# Altium schematic symbol library jlcpcb_2025_04_capacitors_extended_0805.schlib: 3281 symbols (part 17 of 18)
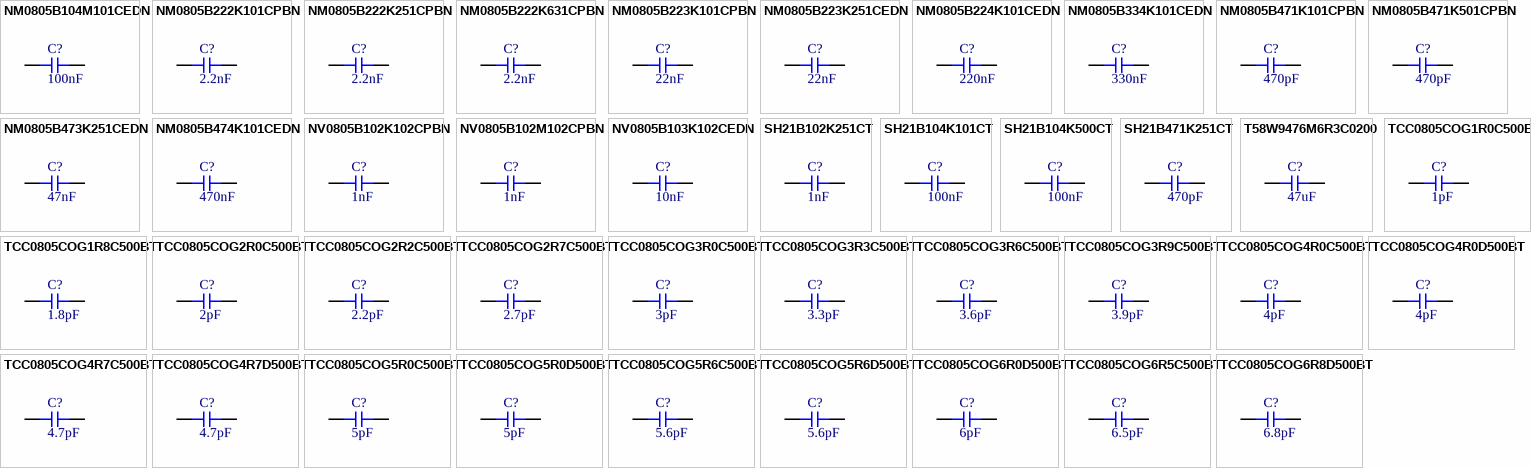
[diagram p98: symbols NM0805B104M101CEDN to TCC0805COG6R8D500BT]

## SH21B104K500CT
designator C?  Capacitance: 100nF  (hidden comment: *)
Capacitor, Ceramic (MLCC), 100nF, ±10%, 50V, X7R, ±10%, SMD 0805; Manufacturer: Walsin Tech Corp; Manufacturer Part Number: SH21B104K500CT; Package Size: 0805; JLCPCB Basic Part: No; JLCPCB Part Number: C384661; Supplier 1: LCSC; Category: Capacitors - MLCC; Supplier Part Number 1: C384661; Tolerance: ±10%; Voltage Rating: 50V; Temperature Coefficient: X7R; RoHS: Yes; ComponentLink1Description: Datasheet; ComponentLink1URL: https://wmsc.lcsc.com/wmsc/upload/file/pdf/v2/lcsc/2401181553_Walsin-Tech-Corp-SH21B104K500CT_C384661.pdf; ComponentLink2Description: JLCPCB Part URL; ComponentLink2URL: https://jlcpcb.com/partdetail/C384661; ComponentLink3Description: LCSC Part URL; ComponentLink3URL: https://lcsc.com/product-detail/Multilayer-Ceramic-Capacitors-MLCC---SMD-SMT_Walsin-Tech-Corp-Walsin-Tech-Corp-SH21B104K500CT_C384661.html
footprint CAP-0805 (0805 (2012M) Capacitor)
pins: 1, 2

## SH21B471K251CT
designator C?  Capacitance: 470pF  (hidden comment: *)
Capacitor, Ceramic (MLCC), 470pF, ±10%, 250V, X7R, ±10%, SMD 0805; Manufacturer: Walsin Tech Corp; Manufacturer Part Number: SH21B471K251CT; Package Size: 0805; JLCPCB Basic Part: No; JLCPCB Part Number: C2859399; Supplier 1: LCSC; Category: Capacitors - MLCC; Supplier Part Number 1: C2859399; Tolerance: ±10%; Voltage Rating: 250V; Temperature Coefficient: X7R; RoHS: Yes; ComponentLink1Description: Datasheet; ComponentLink1URL: https://wmsc.lcsc.com/wmsc/upload/file/pdf/v2/lcsc/2108150330_Walsin-Tech-Corp-SH21B471K251CT_C2859399.pdf; ComponentLink2Description: JLCPCB Part URL; ComponentLink2URL: https://jlcpcb.com/partdetail/C2859399; ComponentLink3Description: LCSC Part URL; ComponentLink3URL: https://lcsc.com/product-detail/Multilayer-Ceramic-Capacitors-MLCC---SMD-SMT_Walsin-Tech-Corp-Walsin-Tech-Corp-SH21B471K251CT_C2859399.html
footprint CAP-0805 (0805 (2012M) Capacitor)
pins: 1, 2

## T58W9476M6R3C0200
designator C?  Capacitance: 47uF  (hidden comment: *)
Capacitor, Ceramic (MLCC), 47uF, ±20%, ±20%, SMD 0805; Manufacturer: Vishay Intertech; Manufacturer Part Number: T58W9476M6R3C0200; Package Size: 0805; JLCPCB Basic Part: No; JLCPCB Part Number: C3008877; Supplier 1: LCSC; Category: Capacitors - MLCC; Supplier Part Number 1: C3008877; Tolerance: ±20%; RoHS: Yes; ComponentLink1Description: Datasheet; ComponentLink1URL: https://wmsc.lcsc.com/wmsc/upload/file/pdf/v2/lcsc/2206101730_Vishay-Intertech-T58W9476M6R3C0200_C3008877.pdf; ComponentLink2Description: JLCPCB Part URL; ComponentLink2URL: https://jlcpcb.com/partdetail/C3008877; ComponentLink3Description: LCSC Part URL; ComponentLink3URL: https://lcsc.com/product-detail/Tantalum-Capacitors_Vishay-Intertech-Vishay-Intertech-T58W9476M6R3C0200_C3008877.html
footprint CAP-0805 (0805 (2012M) Capacitor)
pins: 1, 2

## TCC0805COG1R0C500BT
designator C?  Capacitance: 1pF  (hidden comment: *)
Capacitor, Ceramic (MLCC), 1pF, 50V, C0G, SMD 0805; Manufacturer: CCTC; Manufacturer Part Number: TCC0805COG1R0C500BT; Package Size: 0805; JLCPCB Basic Part: No; JLCPCB Part Number: C282692; Supplier 1: LCSC; Category: Capacitors - MLCC; Supplier Part Number 1: C282692; Voltage Rating: 50V; Temperature Coefficient: C0G; RoHS: Yes; ComponentLink1Description: Datasheet; ComponentLink1URL: https://wmsc.lcsc.com/wmsc/upload/file/pdf/v2/lcsc/2304140030_CCTC-TCC0805COG1R0C500BT_C282692.pdf; ComponentLink2Description: JLCPCB Part URL; ComponentLink2URL: https://jlcpcb.com/partdetail/C282692; ComponentLink3Description: LCSC Part URL; ComponentLink3URL: https://lcsc.com/product-detail/Multilayer-Ceramic-Capacitors-MLCC---SMD-SMT_CCTC-CCTC-TCC0805COG1R0C500BT_C282692.html
footprint CAP-0805 (0805 (2012M) Capacitor)
pins: 1, 2

## TCC0805COG1R8C500BT
designator C?  Capacitance: 1.8pF  (hidden comment: *)
Capacitor, Ceramic (MLCC), 1.8pF, 50V, C0G, SMD 0805; Manufacturer: CCTC; Manufacturer Part Number: TCC0805COG1R8C500BT; Package Size: 0805; JLCPCB Basic Part: No; JLCPCB Part Number: C376870; Supplier 1: LCSC; Category: Capacitors - MLCC; Supplier Part Number 1: C376870; Voltage Rating: 50V; Temperature Coefficient: C0G; RoHS: Yes; ComponentLink1Description: Datasheet; ComponentLink1URL: https://wmsc.lcsc.com/wmsc/upload/file/pdf/v2/lcsc/2304140030_CCTC-TCC0805COG1R8C500BT_C376870.pdf; ComponentLink2Description: JLCPCB Part URL; ComponentLink2URL: https://jlcpcb.com/partdetail/C376870; ComponentLink3Description: LCSC Part URL; ComponentLink3URL: https://lcsc.com/product-detail/Multilayer-Ceramic-Capacitors-MLCC---SMD-SMT_CCTC-CCTC-TCC0805COG1R8C500BT_C376870.html
footprint CAP-0805 (0805 (2012M) Capacitor)
pins: 1, 2

## TCC0805COG2R0C500BT
designator C?  Capacitance: 2pF  (hidden comment: *)
Capacitor, Ceramic (MLCC), 2pF, 50V, C0G, SMD 0805; Manufacturer: CCTC; Manufacturer Part Number: TCC0805COG2R0C500BT; Package Size: 0805; JLCPCB Basic Part: No; JLCPCB Part Number: C282695; Supplier 1: LCSC; Category: Capacitors - MLCC; Supplier Part Number 1: C282695; Voltage Rating: 50V; Temperature Coefficient: C0G; RoHS: Yes; ComponentLink1Description: Datasheet; ComponentLink1URL: https://wmsc.lcsc.com/wmsc/upload/file/pdf/v2/lcsc/2304140030_CCTC-TCC0805COG2R0C500BT_C282695.pdf; ComponentLink2Description: JLCPCB Part URL; ComponentLink2URL: https://jlcpcb.com/partdetail/C282695; ComponentLink3Description: LCSC Part URL; ComponentLink3URL: https://lcsc.com/product-detail/Multilayer-Ceramic-Capacitors-MLCC---SMD-SMT_CCTC-CCTC-TCC0805COG2R0C500BT_C282695.html
footprint CAP-0805 (0805 (2012M) Capacitor)
pins: 1, 2

## TCC0805COG2R2C500BT
designator C?  Capacitance: 2.2pF  (hidden comment: *)
Capacitor, Ceramic (MLCC), 2.2pF, 50V, C0G, SMD 0805; Manufacturer: CCTC; Manufacturer Part Number: TCC0805COG2R2C500BT; Package Size: 0805; JLCPCB Basic Part: No; JLCPCB Part Number: C376879; Supplier 1: LCSC; Category: Capacitors - MLCC; Supplier Part Number 1: C376879; Voltage Rating: 50V; Temperature Coefficient: C0G; RoHS: Yes; ComponentLink1Description: Datasheet; ComponentLink1URL: https://wmsc.lcsc.com/wmsc/upload/file/pdf/v2/lcsc/2304140030_CCTC-TCC0805COG2R2C500BT_C376879.pdf; ComponentLink2Description: JLCPCB Part URL; ComponentLink2URL: https://jlcpcb.com/partdetail/C376879; ComponentLink3Description: LCSC Part URL; ComponentLink3URL: https://lcsc.com/product-detail/Multilayer-Ceramic-Capacitors-MLCC---SMD-SMT_CCTC-CCTC-TCC0805COG2R2C500BT_C376879.html
footprint CAP-0805 (0805 (2012M) Capacitor)
pins: 1, 2

## TCC0805COG2R7C500BT
designator C?  Capacitance: 2.7pF  (hidden comment: *)
Capacitor, Ceramic (MLCC), 2.7pF, 50V, C0G, SMD 0805; Manufacturer: CCTC; Manufacturer Part Number: TCC0805COG2R7C500BT; Package Size: 0805; JLCPCB Basic Part: No; JLCPCB Part Number: C282696; Supplier 1: LCSC; Category: Capacitors - MLCC; Supplier Part Number 1: C282696; Voltage Rating: 50V; Temperature Coefficient: C0G; RoHS: Yes; ComponentLink1Description: Datasheet; ComponentLink1URL: https://wmsc.lcsc.com/wmsc/upload/file/pdf/v2/lcsc/2304140030_CCTC-TCC0805COG2R7C500BT_C282696.pdf; ComponentLink2Description: JLCPCB Part URL; ComponentLink2URL: https://jlcpcb.com/partdetail/C282696; ComponentLink3Description: LCSC Part URL; ComponentLink3URL: https://lcsc.com/product-detail/Multilayer-Ceramic-Capacitors-MLCC---SMD-SMT_CCTC-CCTC-TCC0805COG2R7C500BT_C282696.html
footprint CAP-0805 (0805 (2012M) Capacitor)
pins: 1, 2

## TCC0805COG3R0C500BT
designator C?  Capacitance: 3pF  (hidden comment: *)
Capacitor, Ceramic (MLCC), 3pF, 50V, C0G, SMD 0805; Manufacturer: CCTC; Manufacturer Part Number: TCC0805COG3R0C500BT; Package Size: 0805; JLCPCB Basic Part: No; JLCPCB Part Number: C376882; Supplier 1: LCSC; Category: Capacitors - MLCC; Supplier Part Number 1: C376882; Voltage Rating: 50V; Temperature Coefficient: C0G; RoHS: Yes; ComponentLink1Description: Datasheet; ComponentLink1URL: https://wmsc.lcsc.com/wmsc/upload/file/pdf/v2/lcsc/2304140030_CCTC-TCC0805COG3R0C500BT_C376882.pdf; ComponentLink2Description: JLCPCB Part URL; ComponentLink2URL: https://jlcpcb.com/partdetail/C376882; ComponentLink3Description: LCSC Part URL; ComponentLink3URL: https://lcsc.com/product-detail/Multilayer-Ceramic-Capacitors-MLCC---SMD-SMT_CCTC-CCTC-TCC0805COG3R0C500BT_C376882.html
footprint CAP-0805 (0805 (2012M) Capacitor)
pins: 1, 2

## TCC0805COG3R3C500BT
designator C?  Capacitance: 3.3pF  (hidden comment: *)
Capacitor, Ceramic (MLCC), 3.3pF, 50V, C0G, SMD 0805; Manufacturer: CCTC; Manufacturer Part Number: TCC0805COG3R3C500BT; Package Size: 0805; JLCPCB Basic Part: No; JLCPCB Part Number: C376884; Supplier 1: LCSC; Category: Capacitors - MLCC; Supplier Part Number 1: C376884; Voltage Rating: 50V; Temperature Coefficient: C0G; RoHS: Yes; ComponentLink1Description: Datasheet; ComponentLink1URL: https://wmsc.lcsc.com/wmsc/upload/file/pdf/v2/lcsc/2304140030_CCTC-TCC0805COG3R3C500BT_C376884.pdf; ComponentLink2Description: JLCPCB Part URL; ComponentLink2URL: https://jlcpcb.com/partdetail/C376884; ComponentLink3Description: LCSC Part URL; ComponentLink3URL: https://lcsc.com/product-detail/Multilayer-Ceramic-Capacitors-MLCC---SMD-SMT_CCTC-CCTC-TCC0805COG3R3C500BT_C376884.html
footprint CAP-0805 (0805 (2012M) Capacitor)
pins: 1, 2

## TCC0805COG3R6C500BT
designator C?  Capacitance: 3.6pF  (hidden comment: *)
Capacitor, Ceramic (MLCC), 3.6pF, 50V, C0G, SMD 0805; Manufacturer: CCTC; Manufacturer Part Number: TCC0805COG3R6C500BT; Package Size: 0805; JLCPCB Basic Part: No; JLCPCB Part Number: C376886; Supplier 1: LCSC; Category: Capacitors - MLCC; Supplier Part Number 1: C376886; Voltage Rating: 50V; Temperature Coefficient: C0G; RoHS: Yes; ComponentLink1Description: Datasheet; ComponentLink1URL: https://wmsc.lcsc.com/wmsc/upload/file/pdf/v2/lcsc/2304140030_CCTC-TCC0805COG3R6C500BT_C376886.pdf; ComponentLink2Description: JLCPCB Part URL; ComponentLink2URL: https://jlcpcb.com/partdetail/C376886; ComponentLink3Description: LCSC Part URL; ComponentLink3URL: https://lcsc.com/product-detail/Multilayer-Ceramic-Capacitors-MLCC---SMD-SMT_CCTC-CCTC-TCC0805COG3R6C500BT_C376886.html
footprint CAP-0805 (0805 (2012M) Capacitor)
pins: 1, 2

## TCC0805COG3R9C500BT
designator C?  Capacitance: 3.9pF  (hidden comment: *)
Capacitor, Ceramic (MLCC), 3.9pF, 50V, C0G, SMD 0805; Manufacturer: CCTC; Manufacturer Part Number: TCC0805COG3R9C500BT; Package Size: 0805; JLCPCB Basic Part: No; JLCPCB Part Number: C376887; Supplier 1: LCSC; Category: Capacitors - MLCC; Supplier Part Number 1: C376887; Voltage Rating: 50V; Temperature Coefficient: C0G; RoHS: Yes; ComponentLink1Description: Datasheet; ComponentLink1URL: https://wmsc.lcsc.com/wmsc/upload/file/pdf/v2/lcsc/2304140030_CCTC-TCC0805COG3R9C500BT_C376887.pdf; ComponentLink2Description: JLCPCB Part URL; ComponentLink2URL: https://jlcpcb.com/partdetail/C376887; ComponentLink3Description: LCSC Part URL; ComponentLink3URL: https://lcsc.com/product-detail/Multilayer-Ceramic-Capacitors-MLCC---SMD-SMT_CCTC-CCTC-TCC0805COG3R9C500BT_C376887.html
footprint CAP-0805 (0805 (2012M) Capacitor)
pins: 1, 2

## TCC0805COG4R0C500BT
designator C?  Capacitance: 4pF  (hidden comment: *)
Capacitor, Ceramic (MLCC), 4pF, 50V, C0G, SMD 0805; Manufacturer: CCTC; Manufacturer Part Number: TCC0805COG4R0C500BT; Package Size: 0805; JLCPCB Basic Part: No; JLCPCB Part Number: C282704; Supplier 1: LCSC; Category: Capacitors - MLCC; Supplier Part Number 1: C282704; Voltage Rating: 50V; Temperature Coefficient: C0G; RoHS: Yes; ComponentLink1Description: Datasheet; ComponentLink1URL: https://wmsc.lcsc.com/wmsc/upload/file/pdf/v2/lcsc/2304140030_CCTC-TCC0805COG4R0C500BT_C282704.pdf; ComponentLink2Description: JLCPCB Part URL; ComponentLink2URL: https://jlcpcb.com/partdetail/C282704; ComponentLink3Description: LCSC Part URL; ComponentLink3URL: https://lcsc.com/product-detail/Multilayer-Ceramic-Capacitors-MLCC---SMD-SMT_CCTC-CCTC-TCC0805COG4R0C500BT_C282704.html
footprint CAP-0805 (0805 (2012M) Capacitor)
pins: 1, 2

## TCC0805COG4R0D500BT
designator C?  Capacitance: 4pF  (hidden comment: *)
Capacitor, Ceramic (MLCC), 4pF, 50V, C0G, SMD 0805; Manufacturer: CCTC; Manufacturer Part Number: TCC0805COG4R0D500BT; Package Size: 0805; JLCPCB Basic Part: No; JLCPCB Part Number: C376897; Supplier 1: LCSC; Category: Capacitors - MLCC; Supplier Part Number 1: C376897; Voltage Rating: 50V; Temperature Coefficient: C0G; RoHS: Yes; ComponentLink1Description: Datasheet; ComponentLink1URL: https://wmsc.lcsc.com/wmsc/upload/file/pdf/v2/lcsc/2304140030_CCTC-TCC0805COG4R0D500BT_C376897.pdf; ComponentLink2Description: JLCPCB Part URL; ComponentLink2URL: https://jlcpcb.com/partdetail/C376897; ComponentLink3Description: LCSC Part URL; ComponentLink3URL: https://lcsc.com/product-detail/Multilayer-Ceramic-Capacitors-MLCC---SMD-SMT_CCTC-CCTC-TCC0805COG4R0D500BT_C376897.html
footprint CAP-0805 (0805 (2012M) Capacitor)
pins: 1, 2

## TCC0805COG4R7C500BT
designator C?  Capacitance: 4.7pF  (hidden comment: *)
Capacitor, Ceramic (MLCC), 4.7pF, 50V, C0G, SMD 0805; Manufacturer: CCTC; Manufacturer Part Number: TCC0805COG4R7C500BT; Package Size: 0805; JLCPCB Basic Part: No; JLCPCB Part Number: C376898; Supplier 1: LCSC; Category: Capacitors - MLCC; Supplier Part Number 1: C376898; Voltage Rating: 50V; Temperature Coefficient: C0G; RoHS: Yes; ComponentLink1Description: Datasheet; ComponentLink1URL: https://wmsc.lcsc.com/wmsc/upload/file/pdf/v2/lcsc/2304140030_CCTC-TCC0805COG4R7C500BT_C376898.pdf; ComponentLink2Description: JLCPCB Part URL; ComponentLink2URL: https://jlcpcb.com/partdetail/C376898; ComponentLink3Description: LCSC Part URL; ComponentLink3URL: https://lcsc.com/product-detail/Multilayer-Ceramic-Capacitors-MLCC---SMD-SMT_CCTC-CCTC-TCC0805COG4R7C500BT_C376898.html
footprint CAP-0805 (0805 (2012M) Capacitor)
pins: 1, 2

## TCC0805COG4R7D500BT
designator C?  Capacitance: 4.7pF  (hidden comment: *)
Capacitor, Ceramic (MLCC), 4.7pF, 50V, C0G, SMD 0805; Manufacturer: CCTC; Manufacturer Part Number: TCC0805COG4R7D500BT; Package Size: 0805; JLCPCB Basic Part: No; JLCPCB Part Number: C376899; Supplier 1: LCSC; Category: Capacitors - MLCC; Supplier Part Number 1: C376899; Voltage Rating: 50V; Temperature Coefficient: C0G; RoHS: Yes; ComponentLink1Description: Datasheet; ComponentLink1URL: https://wmsc.lcsc.com/wmsc/upload/file/pdf/v2/lcsc/2304140030_CCTC-TCC0805COG4R7D500BT_C376899.pdf; ComponentLink2Description: JLCPCB Part URL; ComponentLink2URL: https://jlcpcb.com/partdetail/C376899; ComponentLink3Description: LCSC Part URL; ComponentLink3URL: https://lcsc.com/product-detail/Multilayer-Ceramic-Capacitors-MLCC---SMD-SMT_CCTC-CCTC-TCC0805COG4R7D500BT_C376899.html
footprint CAP-0805 (0805 (2012M) Capacitor)
pins: 1, 2

## TCC0805COG5R0C500BT
designator C?  Capacitance: 5pF  (hidden comment: *)
Capacitor, Ceramic (MLCC), 5pF, 50V, C0G, SMD 0805; Manufacturer: CCTC; Manufacturer Part Number: TCC0805COG5R0C500BT; Package Size: 0805; JLCPCB Basic Part: No; JLCPCB Part Number: C309040; Supplier 1: LCSC; Category: Capacitors - MLCC; Supplier Part Number 1: C309040; Voltage Rating: 50V; Temperature Coefficient: C0G; RoHS: Yes; ComponentLink1Description: Datasheet; ComponentLink1URL: https://wmsc.lcsc.com/wmsc/upload/file/pdf/v2/lcsc/2304140030_CCTC-TCC0805COG5R0C500BT_C309040.pdf; ComponentLink2Description: JLCPCB Part URL; ComponentLink2URL: https://jlcpcb.com/partdetail/C309040; ComponentLink3Description: LCSC Part URL; ComponentLink3URL: https://lcsc.com/product-detail/Multilayer-Ceramic-Capacitors-MLCC---SMD-SMT_CCTC-CCTC-TCC0805COG5R0C500BT_C309040.html
footprint CAP-0805 (0805 (2012M) Capacitor)
pins: 1, 2

## TCC0805COG5R0D500BT
designator C?  Capacitance: 5pF  (hidden comment: *)
Capacitor, Ceramic (MLCC), 5pF, 50V, C0G, SMD 0805; Manufacturer: CCTC; Manufacturer Part Number: TCC0805COG5R0D500BT; Package Size: 0805; JLCPCB Basic Part: No; JLCPCB Part Number: C376901; Supplier 1: LCSC; Category: Capacitors - MLCC; Supplier Part Number 1: C376901; Voltage Rating: 50V; Temperature Coefficient: C0G; RoHS: Yes; ComponentLink1Description: Datasheet; ComponentLink1URL: https://wmsc.lcsc.com/wmsc/upload/file/pdf/v2/lcsc/2304140030_CCTC-TCC0805COG5R0D500BT_C376901.pdf; ComponentLink2Description: JLCPCB Part URL; ComponentLink2URL: https://jlcpcb.com/partdetail/C376901; ComponentLink3Description: LCSC Part URL; ComponentLink3URL: https://lcsc.com/product-detail/Multilayer-Ceramic-Capacitors-MLCC---SMD-SMT_CCTC-CCTC-TCC0805COG5R0D500BT_C376901.html
footprint CAP-0805 (0805 (2012M) Capacitor)
pins: 1, 2

## TCC0805COG5R6C500BT
designator C?  Capacitance: 5.6pF  (hidden comment: *)
Capacitor, Ceramic (MLCC), 5.6pF, 50V, C0G, SMD 0805; Manufacturer: CCTC; Manufacturer Part Number: TCC0805COG5R6C500BT; Package Size: 0805; JLCPCB Basic Part: No; JLCPCB Part Number: C376902; Supplier 1: LCSC; Category: Capacitors - MLCC; Supplier Part Number 1: C376902; Voltage Rating: 50V; Temperature Coefficient: C0G; RoHS: Yes; ComponentLink1Description: Datasheet; ComponentLink1URL: https://wmsc.lcsc.com/wmsc/upload/file/pdf/v2/lcsc/2304140030_CCTC-TCC0805COG5R6C500BT_C376902.pdf; ComponentLink2Description: JLCPCB Part URL; ComponentLink2URL: https://jlcpcb.com/partdetail/C376902; ComponentLink3Description: LCSC Part URL; ComponentLink3URL: https://lcsc.com/product-detail/Multilayer-Ceramic-Capacitors-MLCC---SMD-SMT_CCTC-CCTC-TCC0805COG5R6C500BT_C376902.html
footprint CAP-0805 (0805 (2012M) Capacitor)
pins: 1, 2

## TCC0805COG5R6D500BT
designator C?  Capacitance: 5.6pF  (hidden comment: *)
Capacitor, Ceramic (MLCC), 5.6pF, 50V, C0G, SMD 0805; Manufacturer: CCTC; Manufacturer Part Number: TCC0805COG5R6D500BT; Package Size: 0805; JLCPCB Basic Part: No; JLCPCB Part Number: C376903; Supplier 1: LCSC; Category: Capacitors - MLCC; Supplier Part Number 1: C376903; Voltage Rating: 50V; Temperature Coefficient: C0G; RoHS: Yes; ComponentLink1Description: Datasheet; ComponentLink1URL: https://wmsc.lcsc.com/wmsc/upload/file/pdf/v2/lcsc/2304140030_CCTC-TCC0805COG5R6D500BT_C376903.pdf; ComponentLink2Description: JLCPCB Part URL; ComponentLink2URL: https://jlcpcb.com/partdetail/C376903; ComponentLink3Description: LCSC Part URL; ComponentLink3URL: https://lcsc.com/product-detail/Multilayer-Ceramic-Capacitors-MLCC---SMD-SMT_CCTC-CCTC-TCC0805COG5R6D500BT_C376903.html
footprint CAP-0805 (0805 (2012M) Capacitor)
pins: 1, 2

## TCC0805COG6R0D500BT
designator C?  Capacitance: 6pF  (hidden comment: *)
Capacitor, Ceramic (MLCC), 6pF, 50V, C0G, SMD 0805; Manufacturer: CCTC; Manufacturer Part Number: TCC0805COG6R0D500BT; Package Size: 0805; JLCPCB Basic Part: No; JLCPCB Part Number: C282709; Supplier 1: LCSC; Category: Capacitors - MLCC; Supplier Part Number 1: C282709; Voltage Rating: 50V; Temperature Coefficient: C0G; RoHS: Yes; ComponentLink1Description: Datasheet; ComponentLink1URL: https://wmsc.lcsc.com/wmsc/upload/file/pdf/v2/lcsc/2304140030_CCTC-TCC0805COG6R0D500BT_C282709.pdf; ComponentLink2Description: JLCPCB Part URL; ComponentLink2URL: https://jlcpcb.com/partdetail/C282709; ComponentLink3Description: LCSC Part URL; ComponentLink3URL: https://lcsc.com/product-detail/Multilayer-Ceramic-Capacitors-MLCC---SMD-SMT_CCTC-CCTC-TCC0805COG6R0D500BT_C282709.html
footprint CAP-0805 (0805 (2012M) Capacitor)
pins: 1, 2

## TCC0805COG6R5C500BT
designator C?  Capacitance: 6.5pF  (hidden comment: *)
Capacitor, Ceramic (MLCC), 6.5pF, 50V, C0G, SMD 0805; Manufacturer: CCTC; Manufacturer Part Number: TCC0805COG6R5C500BT; Package Size: 0805; JLCPCB Basic Part: No; JLCPCB Part Number: C376907; Supplier 1: LCSC; Category: Capacitors - MLCC; Supplier Part Number 1: C376907; Voltage Rating: 50V; Temperature Coefficient: C0G; RoHS: Yes; ComponentLink1Description: Datasheet; ComponentLink1URL: https://wmsc.lcsc.com/wmsc/upload/file/pdf/v2/lcsc/2304140030_CCTC-TCC0805COG6R5C500BT_C376907.pdf; ComponentLink2Description: JLCPCB Part URL; ComponentLink2URL: https://jlcpcb.com/partdetail/C376907; ComponentLink3Description: LCSC Part URL; ComponentLink3URL: https://lcsc.com/product-detail/Multilayer-Ceramic-Capacitors-MLCC---SMD-SMT_CCTC-CCTC-TCC0805COG6R5C500BT_C376907.html
footprint CAP-0805 (0805 (2012M) Capacitor)
pins: 1, 2

## TCC0805COG6R8D500BT
designator C?  Capacitance: 6.8pF  (hidden comment: *)
Capacitor, Ceramic (MLCC), 6.8pF, 50V, C0G, SMD 0805; Manufacturer: CCTC; Manufacturer Part Number: TCC0805COG6R8D500BT; Package Size: 0805; JLCPCB Basic Part: No; JLCPCB Part Number: C376908; Supplier 1: LCSC; Category: Capacitors - MLCC; Supplier Part Number 1: C376908; Voltage Rating: 50V; Temperature Coefficient: C0G; RoHS: Yes; ComponentLink1Description: Datasheet; ComponentLink1URL: https://wmsc.lcsc.com/wmsc/upload/file/pdf/v2/lcsc/2304140030_CCTC-TCC0805COG6R8D500BT_C376908.pdf; ComponentLink2Description: JLCPCB Part URL; ComponentLink2URL: https://jlcpcb.com/partdetail/C376908; ComponentLink3Description: LCSC Part URL; ComponentLink3URL: https://lcsc.com/product-detail/Multilayer-Ceramic-Capacitors-MLCC---SMD-SMT_CCTC-CCTC-TCC0805COG6R8D500BT_C376908.html
footprint CAP-0805 (0805 (2012M) Capacitor)
pins: 1, 2

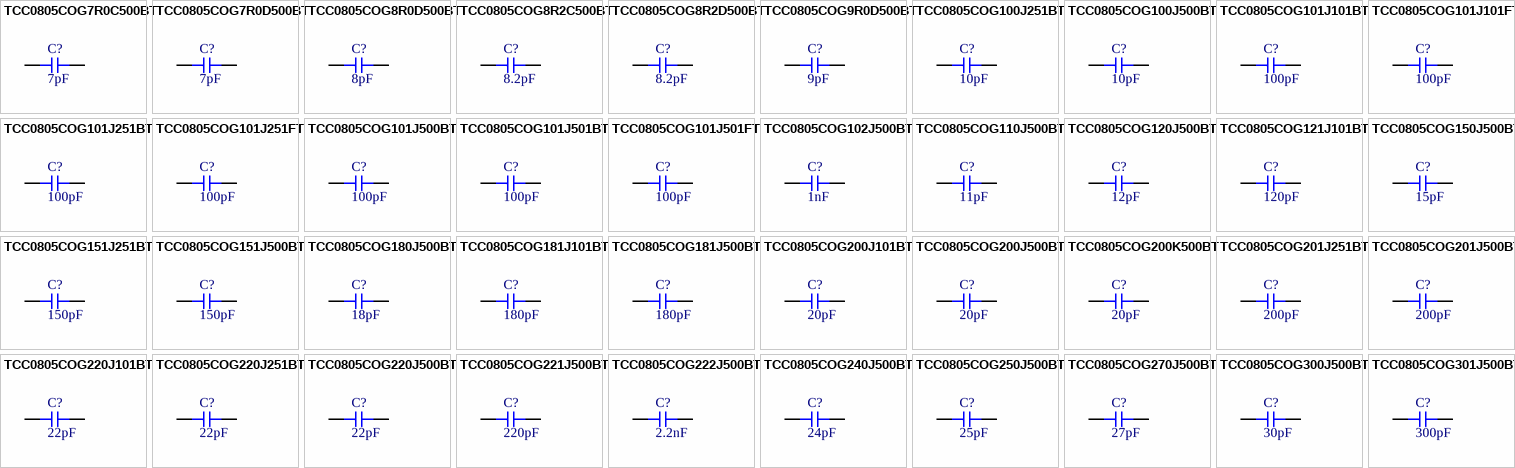
[diagram p74: symbols TCC0805COG7R0C500BT to TCC0805COG301J500BT]

## TCC0805COG7R0C500BT
designator C?  Capacitance: 7pF  (hidden comment: *)
Capacitor, Ceramic (MLCC), 7pF, 50V, C0G, SMD 0805; Manufacturer: CCTC; Manufacturer Part Number: TCC0805COG7R0C500BT; Package Size: 0805; JLCPCB Basic Part: No; JLCPCB Part Number: C282710; Supplier 1: LCSC; Category: Capacitors - MLCC; Supplier Part Number 1: C282710; Voltage Rating: 50V; Temperature Coefficient: C0G; RoHS: Yes; ComponentLink1Description: Datasheet; ComponentLink1URL: https://wmsc.lcsc.com/wmsc/upload/file/pdf/v2/lcsc/2304140030_CCTC-TCC0805COG7R0C500BT_C282710.pdf; ComponentLink2Description: JLCPCB Part URL; ComponentLink2URL: https://jlcpcb.com/partdetail/C282710; ComponentLink3Description: LCSC Part URL; ComponentLink3URL: https://lcsc.com/product-detail/Multilayer-Ceramic-Capacitors-MLCC---SMD-SMT_CCTC-CCTC-TCC0805COG7R0C500BT_C282710.html
footprint CAP-0805 (0805 (2012M) Capacitor)
pins: 1, 2

## TCC0805COG7R0D500BT
designator C?  Capacitance: 7pF  (hidden comment: *)
Capacitor, Ceramic (MLCC), 7pF, 50V, C0G, SMD 0805; Manufacturer: CCTC; Manufacturer Part Number: TCC0805COG7R0D500BT; Package Size: 0805; JLCPCB Basic Part: No; JLCPCB Part Number: C376909; Supplier 1: LCSC; Category: Capacitors - MLCC; Supplier Part Number 1: C376909; Voltage Rating: 50V; Temperature Coefficient: C0G; RoHS: Yes; ComponentLink1Description: Datasheet; ComponentLink1URL: https://wmsc.lcsc.com/wmsc/upload/file/pdf/v2/lcsc/2304140030_CCTC-TCC0805COG7R0D500BT_C376909.pdf; ComponentLink2Description: JLCPCB Part URL; ComponentLink2URL: https://jlcpcb.com/partdetail/C376909; ComponentLink3Description: LCSC Part URL; ComponentLink3URL: https://lcsc.com/product-detail/Multilayer-Ceramic-Capacitors-MLCC---SMD-SMT_CCTC-CCTC-TCC0805COG7R0D500BT_C376909.html
footprint CAP-0805 (0805 (2012M) Capacitor)
pins: 1, 2

## TCC0805COG8R0D500BT
designator C?  Capacitance: 8pF  (hidden comment: *)
Capacitor, Ceramic (MLCC), 8pF, 50V, C0G, SMD 0805; Manufacturer: CCTC; Manufacturer Part Number: TCC0805COG8R0D500BT; Package Size: 0805; JLCPCB Basic Part: No; JLCPCB Part Number: C282713; Supplier 1: LCSC; Category: Capacitors - MLCC; Supplier Part Number 1: C282713; Voltage Rating: 50V; Temperature Coefficient: C0G; RoHS: Yes; ComponentLink1Description: Datasheet; ComponentLink1URL: https://wmsc.lcsc.com/wmsc/upload/file/pdf/v2/lcsc/2304140030_CCTC-TCC0805COG8R0D500BT_C282713.pdf; ComponentLink2Description: JLCPCB Part URL; ComponentLink2URL: https://jlcpcb.com/partdetail/C282713; ComponentLink3Description: LCSC Part URL; ComponentLink3URL: https://lcsc.com/product-detail/Multilayer-Ceramic-Capacitors-MLCC---SMD-SMT_CCTC-CCTC-TCC0805COG8R0D500BT_C282713.html
footprint CAP-0805 (0805 (2012M) Capacitor)
pins: 1, 2

## TCC0805COG8R2C500BT
designator C?  Capacitance: 8.2pF  (hidden comment: *)
Capacitor, Ceramic (MLCC), 8.2pF, 50V, C0G, SMD 0805; Manufacturer: CCTC; Manufacturer Part Number: TCC0805COG8R2C500BT; Package Size: 0805; JLCPCB Basic Part: No; JLCPCB Part Number: C376911; Supplier 1: LCSC; Category: Capacitors - MLCC; Supplier Part Number 1: C376911; Voltage Rating: 50V; Temperature Coefficient: C0G; RoHS: Yes; ComponentLink1Description: Datasheet; ComponentLink1URL: https://wmsc.lcsc.com/wmsc/upload/file/pdf/v2/lcsc/2304140030_CCTC-TCC0805COG8R2C500BT_C376911.pdf; ComponentLink2Description: JLCPCB Part URL; ComponentLink2URL: https://jlcpcb.com/partdetail/C376911; ComponentLink3Description: LCSC Part URL; ComponentLink3URL: https://lcsc.com/product-detail/Multilayer-Ceramic-Capacitors-MLCC---SMD-SMT_CCTC-CCTC-TCC0805COG8R2C500BT_C376911.html
footprint CAP-0805 (0805 (2012M) Capacitor)
pins: 1, 2

## TCC0805COG8R2D500BT
designator C?  Capacitance: 8.2pF  (hidden comment: *)
Capacitor, Ceramic (MLCC), 8.2pF, 50V, C0G, SMD 0805; Manufacturer: CCTC; Manufacturer Part Number: TCC0805COG8R2D500BT; Package Size: 0805; JLCPCB Basic Part: No; JLCPCB Part Number: C376912; Supplier 1: LCSC; Category: Capacitors - MLCC; Supplier Part Number 1: C376912; Voltage Rating: 50V; Temperature Coefficient: C0G; RoHS: Yes; ComponentLink1Description: Datasheet; ComponentLink1URL: https://wmsc.lcsc.com/wmsc/upload/file/pdf/v2/lcsc/2304140030_CCTC-TCC0805COG8R2D500BT_C376912.pdf; ComponentLink2Description: JLCPCB Part URL; ComponentLink2URL: https://jlcpcb.com/partdetail/C376912; ComponentLink3Description: LCSC Part URL; ComponentLink3URL: https://lcsc.com/product-detail/Multilayer-Ceramic-Capacitors-MLCC---SMD-SMT_CCTC-CCTC-TCC0805COG8R2D500BT_C376912.html
footprint CAP-0805 (0805 (2012M) Capacitor)
pins: 1, 2

## TCC0805COG9R0D500BT
designator C?  Capacitance: 9pF  (hidden comment: *)
Capacitor, Ceramic (MLCC), 9pF, 50V, C0G, SMD 0805; Manufacturer: CCTC; Manufacturer Part Number: TCC0805COG9R0D500BT; Package Size: 0805; JLCPCB Basic Part: No; JLCPCB Part Number: C282714; Supplier 1: LCSC; Category: Capacitors - MLCC; Supplier Part Number 1: C282714; Voltage Rating: 50V; Temperature Coefficient: C0G; RoHS: Yes; ComponentLink1Description: Datasheet; ComponentLink1URL: https://wmsc.lcsc.com/wmsc/upload/file/pdf/v2/lcsc/2207211200_CCTC-TCC0805COG9R0D500BT_C282714.pdf; ComponentLink2Description: JLCPCB Part URL; ComponentLink2URL: https://jlcpcb.com/partdetail/C282714; ComponentLink3Description: LCSC Part URL; ComponentLink3URL: https://lcsc.com/product-detail/Multilayer-Ceramic-Capacitors-MLCC---SMD-SMT_CCTC-CCTC-TCC0805COG9R0D500BT_C282714.html
footprint CAP-0805 (0805 (2012M) Capacitor)
pins: 1, 2

## TCC0805COG100J251BT
designator C?  Capacitance: 10pF  (hidden comment: *)
Capacitor, Ceramic (MLCC), 10pF, ±5%, 250V, C0G, ±5%, SMD 0805; Manufacturer: CCTC; Manufacturer Part Number: TCC0805COG100J251BT; Package Size: 0805; JLCPCB Basic Part: No; JLCPCB Part Number: C282690; Supplier 1: LCSC; Category: Capacitors - MLCC; Supplier Part Number 1: C282690; Tolerance: ±5%; Voltage Rating: 250V; Temperature Coefficient: C0G; RoHS: Yes; ComponentLink1Description: Datasheet; ComponentLink1URL: https://wmsc.lcsc.com/wmsc/upload/file/pdf/v2/lcsc/2304140030_CCTC-TCC0805COG100J251BT_C282690.pdf; ComponentLink2Description: JLCPCB Part URL; ComponentLink2URL: https://jlcpcb.com/partdetail/C282690; ComponentLink3Description: LCSC Part URL; ComponentLink3URL: https://lcsc.com/product-detail/Multilayer-Ceramic-Capacitors-MLCC---SMD-SMT_CCTC-CCTC-TCC0805COG100J251BT_C282690.html
footprint CAP-0805 (0805 (2012M) Capacitor)
pins: 1, 2

## TCC0805COG100J500BT
designator C?  Capacitance: 10pF  (hidden comment: *)
Capacitor, Ceramic (MLCC), 10pF, ±5%, 50V, C0G, ±5%, SMD 0805; Manufacturer: CCTC; Manufacturer Part Number: TCC0805COG100J500BT; Package Size: 0805; JLCPCB Basic Part: No; JLCPCB Part Number: C344177; Supplier 1: LCSC; Category: Capacitors - MLCC; Supplier Part Number 1: C344177; Tolerance: ±5%; Voltage Rating: 50V; Temperature Coefficient: C0G; RoHS: Yes; ComponentLink1Description: Datasheet; ComponentLink1URL: https://wmsc.lcsc.com/wmsc/upload/file/pdf/v2/lcsc/2304140030_CCTC-TCC0805COG100J500BT_C344177.pdf; ComponentLink2Description: JLCPCB Part URL; ComponentLink2URL: https://jlcpcb.com/partdetail/C344177; ComponentLink3Description: LCSC Part URL; ComponentLink3URL: https://lcsc.com/product-detail/Multilayer-Ceramic-Capacitors-MLCC---SMD-SMT_CCTC-CCTC-TCC0805COG100J500BT_C344177.html
footprint CAP-0805 (0805 (2012M) Capacitor)
pins: 1, 2

## TCC0805COG101J101BT
designator C?  Capacitance: 100pF  (hidden comment: *)
Capacitor, Ceramic (MLCC), 100pF, ±5%, 100V, C0G, ±5%, SMD 0805; Manufacturer: CCTC; Manufacturer Part Number: TCC0805COG101J101BT; Package Size: 0805; JLCPCB Basic Part: No; JLCPCB Part Number: C376854; Supplier 1: LCSC; Category: Capacitors - MLCC; Supplier Part Number 1: C376854; Tolerance: ±5%; Voltage Rating: 100V; Temperature Coefficient: C0G; RoHS: Yes; ComponentLink1Description: Datasheet; ComponentLink1URL: https://wmsc.lcsc.com/wmsc/upload/file/pdf/v2/lcsc/2304140030_CCTC-TCC0805COG101J101BT_C376854.pdf; ComponentLink2Description: JLCPCB Part URL; ComponentLink2URL: https://jlcpcb.com/partdetail/C376854; ComponentLink3Description: LCSC Part URL; ComponentLink3URL: https://lcsc.com/product-detail/Multilayer-Ceramic-Capacitors-MLCC---SMD-SMT_CCTC-CCTC-TCC0805COG101J101BT_C376854.html
footprint CAP-0805 (0805 (2012M) Capacitor)
pins: 1, 2

## TCC0805COG101J101FT
designator C?  Capacitance: 100pF  (hidden comment: *)
Capacitor, Ceramic (MLCC), 100pF, ±5%, 100V, C0G, ±5%, SMD 0805; Manufacturer: CCTC; Manufacturer Part Number: TCC0805COG101J101FT; Package Size: 0805; JLCPCB Basic Part: No; JLCPCB Part Number: C376855; Supplier 1: LCSC; Category: Capacitors - MLCC; Supplier Part Number 1: C376855; Tolerance: ±5%; Voltage Rating: 100V; Temperature Coefficient: C0G; RoHS: Yes; ComponentLink1Description: Datasheet; ComponentLink1URL: https://wmsc.lcsc.com/wmsc/upload/file/pdf/v2/lcsc/2304140030_CCTC-TCC0805COG101J101FT_C376855.pdf; ComponentLink2Description: JLCPCB Part URL; ComponentLink2URL: https://jlcpcb.com/partdetail/C376855; ComponentLink3Description: LCSC Part URL; ComponentLink3URL: https://lcsc.com/product-detail/Multilayer-Ceramic-Capacitors-MLCC---SMD-SMT_CCTC-CCTC-TCC0805COG101J101FT_C376855.html
footprint CAP-0805 (0805 (2012M) Capacitor)
pins: 1, 2

## TCC0805COG101J251BT
designator C?  Capacitance: 100pF  (hidden comment: *)
Capacitor, Ceramic (MLCC), 100pF, ±5%, 250V, C0G, ±5%, SMD 0805; Manufacturer: CCTC; Manufacturer Part Number: TCC0805COG101J251BT; Package Size: 0805; JLCPCB Basic Part: No; JLCPCB Part Number: C376857; Supplier 1: LCSC; Category: Capacitors - MLCC; Supplier Part Number 1: C376857; Tolerance: ±5%; Voltage Rating: 250V; Temperature Coefficient: C0G; RoHS: Yes; ComponentLink1Description: Datasheet; ComponentLink1URL: https://wmsc.lcsc.com/wmsc/upload/file/pdf/v2/lcsc/2304140030_CCTC-TCC0805COG101J251BT_C376857.pdf; ComponentLink2Description: JLCPCB Part URL; ComponentLink2URL: https://jlcpcb.com/partdetail/C376857; ComponentLink3Description: LCSC Part URL; ComponentLink3URL: https://lcsc.com/product-detail/Multilayer-Ceramic-Capacitors-MLCC---SMD-SMT_CCTC-CCTC-TCC0805COG101J251BT_C376857.html
footprint CAP-0805 (0805 (2012M) Capacitor)
pins: 1, 2

## TCC0805COG101J251FT
designator C?  Capacitance: 100pF  (hidden comment: *)
Capacitor, Ceramic (MLCC), 100pF, ±5%, 250V, C0G, ±5%, SMD 0805; Manufacturer: CCTC; Manufacturer Part Number: TCC0805COG101J251FT; Package Size: 0805; JLCPCB Basic Part: No; JLCPCB Part Number: C376858; Supplier 1: LCSC; Category: Capacitors - MLCC; Supplier Part Number 1: C376858; Tolerance: ±5%; Voltage Rating: 250V; Temperature Coefficient: C0G; RoHS: Yes; ComponentLink1Description: Datasheet; ComponentLink1URL: https://wmsc.lcsc.com/wmsc/upload/file/pdf/v2/lcsc/2304140030_CCTC-TCC0805COG101J251FT_C376858.pdf; ComponentLink2Description: JLCPCB Part URL; ComponentLink2URL: https://jlcpcb.com/partdetail/C376858; ComponentLink3Description: LCSC Part URL; ComponentLink3URL: https://lcsc.com/product-detail/Multilayer-Ceramic-Capacitors-MLCC---SMD-SMT_CCTC-CCTC-TCC0805COG101J251FT_C376858.html
footprint CAP-0805 (0805 (2012M) Capacitor)
pins: 1, 2

## TCC0805COG101J500BT
designator C?  Capacitance: 100pF  (hidden comment: *)
Capacitor, Ceramic (MLCC), 100pF, ±5%, 50V, C0G, ±5%, SMD 0805; Manufacturer: CCTC; Manufacturer Part Number: TCC0805COG101J500BT; Package Size: 0805; JLCPCB Basic Part: No; JLCPCB Part Number: C376859; Supplier 1: LCSC; Category: Capacitors - MLCC; Supplier Part Number 1: C376859; Tolerance: ±5%; Voltage Rating: 50V; Temperature Coefficient: C0G; RoHS: Yes; ComponentLink1Description: Datasheet; ComponentLink1URL: https://wmsc.lcsc.com/wmsc/upload/file/pdf/v2/lcsc/2304140030_CCTC-TCC0805COG101J500BT_C376859.pdf; ComponentLink2Description: JLCPCB Part URL; ComponentLink2URL: https://jlcpcb.com/partdetail/C376859; ComponentLink3Description: LCSC Part URL; ComponentLink3URL: https://lcsc.com/product-detail/Multilayer-Ceramic-Capacitors-MLCC---SMD-SMT_CCTC-CCTC-TCC0805COG101J500BT_C376859.html
footprint CAP-0805 (0805 (2012M) Capacitor)
pins: 1, 2

## TCC0805COG101J501BT
designator C?  Capacitance: 100pF  (hidden comment: *)
Capacitor, Ceramic (MLCC), 100pF, ±5%, 500V, C0G, ±5%, SMD 0805; Manufacturer: CCTC; Manufacturer Part Number: TCC0805COG101J501BT; Package Size: 0805; JLCPCB Basic Part: No; JLCPCB Part Number: C696866; Supplier 1: LCSC; Category: Capacitors - MLCC; Supplier Part Number 1: C696866; Tolerance: ±5%; Voltage Rating: 500V; Temperature Coefficient: C0G; RoHS: Yes; ComponentLink1Description: Datasheet; ComponentLink1URL: https://wmsc.lcsc.com/wmsc/upload/file/pdf/v2/lcsc/2304140030_CCTC-TCC0805COG101J501BT_C696866.pdf; ComponentLink2Description: JLCPCB Part URL; ComponentLink2URL: https://jlcpcb.com/partdetail/C696866; ComponentLink3Description: LCSC Part URL; ComponentLink3URL: https://lcsc.com/product-detail/Multilayer-Ceramic-Capacitors-MLCC---SMD-SMT_CCTC-CCTC-TCC0805COG101J501BT_C696866.html
footprint CAP-0805 (0805 (2012M) Capacitor)
pins: 1, 2

## TCC0805COG101J501FT
designator C?  Capacitance: 100pF  (hidden comment: *)
Capacitor, Ceramic (MLCC), 100pF, ±5%, 500V, C0G, ±5%, SMD 0805; Manufacturer: CCTC; Manufacturer Part Number: TCC0805COG101J501FT; Package Size: 0805; JLCPCB Basic Part: No; JLCPCB Part Number: C376860; Supplier 1: LCSC; Category: Capacitors - MLCC; Supplier Part Number 1: C376860; Tolerance: ±5%; Voltage Rating: 500V; Temperature Coefficient: C0G; RoHS: Yes; ComponentLink1Description: Datasheet; ComponentLink1URL: https://wmsc.lcsc.com/wmsc/upload/file/pdf/v2/lcsc/2304140030_CCTC-TCC0805COG101J501FT_C376860.pdf; ComponentLink2Description: JLCPCB Part URL; ComponentLink2URL: https://jlcpcb.com/partdetail/C376860; ComponentLink3Description: LCSC Part URL; ComponentLink3URL: https://lcsc.com/product-detail/Multilayer-Ceramic-Capacitors-MLCC---SMD-SMT_CCTC-CCTC-TCC0805COG101J501FT_C376860.html
footprint CAP-0805 (0805 (2012M) Capacitor)
pins: 1, 2

## TCC0805COG102J500BT
designator C?  Capacitance: 1nF  (hidden comment: *)
Capacitor, Ceramic (MLCC), 1nF, ±5%, 50V, C0G, ±5%, SMD 0805; Manufacturer: CCTC; Manufacturer Part Number: TCC0805COG102J500BT; Package Size: 0805; JLCPCB Basic Part: No; JLCPCB Part Number: C376861; Supplier 1: LCSC; Category: Capacitors - MLCC; Supplier Part Number 1: C376861; Tolerance: ±5%; Voltage Rating: 50V; Temperature Coefficient: C0G; RoHS: Yes; ComponentLink1Description: Datasheet; ComponentLink1URL: https://wmsc.lcsc.com/wmsc/upload/file/pdf/v2/lcsc/2304140030_CCTC-TCC0805COG102J500BT_C376861.pdf; ComponentLink2Description: JLCPCB Part URL; ComponentLink2URL: https://jlcpcb.com/partdetail/C376861; ComponentLink3Description: LCSC Part URL; ComponentLink3URL: https://lcsc.com/product-detail/Multilayer-Ceramic-Capacitors-MLCC---SMD-SMT_CCTC-CCTC-TCC0805COG102J500BT_C376861.html
footprint CAP-0805 (0805 (2012M) Capacitor)
pins: 1, 2

## TCC0805COG110J500BT
designator C?  Capacitance: 11pF  (hidden comment: *)
Capacitor, Ceramic (MLCC), 11pF, ±5%, 50V, C0G, ±5%, SMD 0805; Manufacturer: CCTC; Manufacturer Part Number: TCC0805COG110J500BT; Package Size: 0805; JLCPCB Basic Part: No; JLCPCB Part Number: C376862; Supplier 1: LCSC; Category: Capacitors - MLCC; Supplier Part Number 1: C376862; Tolerance: ±5%; Voltage Rating: 50V; Temperature Coefficient: C0G; RoHS: Yes; ComponentLink1Description: Datasheet; ComponentLink1URL: https://wmsc.lcsc.com/wmsc/upload/file/pdf/v2/lcsc/2304140030_CCTC-TCC0805COG110J500BT_C376862.pdf; ComponentLink2Description: JLCPCB Part URL; ComponentLink2URL: https://jlcpcb.com/partdetail/C376862; ComponentLink3Description: LCSC Part URL; ComponentLink3URL: https://lcsc.com/product-detail/Multilayer-Ceramic-Capacitors-MLCC---SMD-SMT_CCTC-CCTC-TCC0805COG110J500BT_C376862.html
footprint CAP-0805 (0805 (2012M) Capacitor)
pins: 1, 2

## TCC0805COG120J500BT
designator C?  Capacitance: 12pF  (hidden comment: *)
Capacitor, Ceramic (MLCC), 12pF, ±5%, 50V, C0G, ±5%, SMD 0805; Manufacturer: CCTC; Manufacturer Part Number: TCC0805COG120J500BT; Package Size: 0805; JLCPCB Basic Part: No; JLCPCB Part Number: C376863; Supplier 1: LCSC; Category: Capacitors - MLCC; Supplier Part Number 1: C376863; Tolerance: ±5%; Voltage Rating: 50V; Temperature Coefficient: C0G; RoHS: Yes; ComponentLink1Description: Datasheet; ComponentLink1URL: https://wmsc.lcsc.com/wmsc/upload/file/pdf/v2/lcsc/2304140030_CCTC-TCC0805COG120J500BT_C376863.pdf; ComponentLink2Description: JLCPCB Part URL; ComponentLink2URL: https://jlcpcb.com/partdetail/C376863; ComponentLink3Description: LCSC Part URL; ComponentLink3URL: https://lcsc.com/product-detail/Multilayer-Ceramic-Capacitors-MLCC---SMD-SMT_CCTC-CCTC-TCC0805COG120J500BT_C376863.html
footprint CAP-0805 (0805 (2012M) Capacitor)
pins: 1, 2

## TCC0805COG121J101BT
designator C?  Capacitance: 120pF  (hidden comment: *)
Capacitor, Ceramic (MLCC), 120pF, ±5%, 100V, C0G, ±5%, SMD 0805; Manufacturer: CCTC; Manufacturer Part Number: TCC0805COG121J101BT; Package Size: 0805; JLCPCB Basic Part: No; JLCPCB Part Number: C5375897; Supplier 1: LCSC; Category: Capacitors - MLCC; Supplier Part Number 1: C5375897; Tolerance: ±5%; Voltage Rating: 100V; Temperature Coefficient: C0G; RoHS: Yes; ComponentLink1Description: Datasheet; ComponentLink1URL: https://wmsc.lcsc.com/wmsc/upload/file/pdf/v2/lcsc/2403281710_CCTC-TCC0805COG121J101BT_C5375897.pdf; ComponentLink2Description: JLCPCB Part URL; ComponentLink2URL: https://jlcpcb.com/partdetail/C5375897; ComponentLink3Description: LCSC Part URL; ComponentLink3URL: https://lcsc.com/product-detail/Multilayer-Ceramic-Capacitors-MLCC---SMD-SMT_CCTC-CCTC-TCC0805COG121J101BT_C5375897.html
footprint CAP-0805 (0805 (2012M) Capacitor)
pins: 1, 2

## TCC0805COG150J500BT
designator C?  Capacitance: 15pF  (hidden comment: *)
Capacitor, Ceramic (MLCC), 15pF, ±5%, 50V, C0G, ±5%, SMD 0805; Manufacturer: CCTC; Manufacturer Part Number: TCC0805COG150J500BT; Package Size: 0805; JLCPCB Basic Part: No; JLCPCB Part Number: C376865; Supplier 1: LCSC; Category: Capacitors - MLCC; Supplier Part Number 1: C376865; Tolerance: ±5%; Voltage Rating: 50V; Temperature Coefficient: C0G; RoHS: Yes; ComponentLink1Description: Datasheet; ComponentLink1URL: https://wmsc.lcsc.com/wmsc/upload/file/pdf/v2/lcsc/2304140030_CCTC-TCC0805COG150J500BT_C376865.pdf; ComponentLink2Description: JLCPCB Part URL; ComponentLink2URL: https://jlcpcb.com/partdetail/C376865; ComponentLink3Description: LCSC Part URL; ComponentLink3URL: https://lcsc.com/product-detail/Multilayer-Ceramic-Capacitors-MLCC---SMD-SMT_CCTC-CCTC-TCC0805COG150J500BT_C376865.html
footprint CAP-0805 (0805 (2012M) Capacitor)
pins: 1, 2

## TCC0805COG151J251BT
designator C?  Capacitance: 150pF  (hidden comment: *)
Capacitor, Ceramic (MLCC), 150pF, ±5%, 250V, C0G, ±5%, SMD 0805; Manufacturer: CCTC; Manufacturer Part Number: TCC0805COG151J251BT; Package Size: 0805; JLCPCB Basic Part: No; JLCPCB Part Number: C282715; Supplier 1: LCSC; Category: Capacitors - MLCC; Supplier Part Number 1: C282715; Tolerance: ±5%; Voltage Rating: 250V; Temperature Coefficient: C0G; RoHS: Yes; ComponentLink1Description: Datasheet; ComponentLink1URL: https://wmsc.lcsc.com/wmsc/upload/file/pdf/v2/lcsc/2304140030_CCTC-TCC0805COG151J251BT_C282715.pdf; ComponentLink2Description: JLCPCB Part URL; ComponentLink2URL: https://jlcpcb.com/partdetail/C282715; ComponentLink3Description: LCSC Part URL; ComponentLink3URL: https://lcsc.com/product-detail/Multilayer-Ceramic-Capacitors-MLCC---SMD-SMT_CCTC-CCTC-TCC0805COG151J251BT_C282715.html
footprint CAP-0805 (0805 (2012M) Capacitor)
pins: 1, 2

## TCC0805COG151J500BT
designator C?  Capacitance: 150pF  (hidden comment: *)
Capacitor, Ceramic (MLCC), 150pF, ±5%, 50V, C0G, ±5%, SMD 0805; Manufacturer: CCTC; Manufacturer Part Number: TCC0805COG151J500BT; Package Size: 0805; JLCPCB Basic Part: No; JLCPCB Part Number: C376866; Supplier 1: LCSC; Category: Capacitors - MLCC; Supplier Part Number 1: C376866; Tolerance: ±5%; Voltage Rating: 50V; Temperature Coefficient: C0G; RoHS: Yes; ComponentLink1Description: Datasheet; ComponentLink1URL: https://wmsc.lcsc.com/wmsc/upload/file/pdf/v2/lcsc/2304140030_CCTC-TCC0805COG151J500BT_C376866.pdf; ComponentLink2Description: JLCPCB Part URL; ComponentLink2URL: https://jlcpcb.com/partdetail/C376866; ComponentLink3Description: LCSC Part URL; ComponentLink3URL: https://lcsc.com/product-detail/Multilayer-Ceramic-Capacitors-MLCC---SMD-SMT_CCTC-CCTC-TCC0805COG151J500BT_C376866.html
footprint CAP-0805 (0805 (2012M) Capacitor)
pins: 1, 2

## TCC0805COG180J500BT
designator C?  Capacitance: 18pF  (hidden comment: *)
Capacitor, Ceramic (MLCC), 18pF, ±5%, 50V, C0G, ±5%, SMD 0805; Manufacturer: CCTC; Manufacturer Part Number: TCC0805COG180J500BT; Package Size: 0805; JLCPCB Basic Part: No; JLCPCB Part Number: C376867; Supplier 1: LCSC; Category: Capacitors - MLCC; Supplier Part Number 1: C376867; Tolerance: ±5%; Voltage Rating: 50V; Temperature Coefficient: C0G; RoHS: Yes; ComponentLink1Description: Datasheet; ComponentLink1URL: https://wmsc.lcsc.com/wmsc/upload/file/pdf/v2/lcsc/2304140030_CCTC-TCC0805COG180J500BT_C376867.pdf; ComponentLink2Description: JLCPCB Part URL; ComponentLink2URL: https://jlcpcb.com/partdetail/C376867; ComponentLink3Description: LCSC Part URL; ComponentLink3URL: https://lcsc.com/product-detail/Multilayer-Ceramic-Capacitors-MLCC---SMD-SMT_CCTC-CCTC-TCC0805COG180J500BT_C376867.html
footprint CAP-0805 (0805 (2012M) Capacitor)
pins: 1, 2
